# Altium footprint library lib_datalogger.PcbLib: 866 footprints (part 7 of 55)
Each footprint in its own frame and in the unit in brackets; x right, y up, seen from the top. Pads: shape width x height; smd on the part's side, far side on the other; paste and mask are expansions set on the pad; w line width, h text height; cw(c..) or ccw(c..) is an arc to the next point about the centre after c.
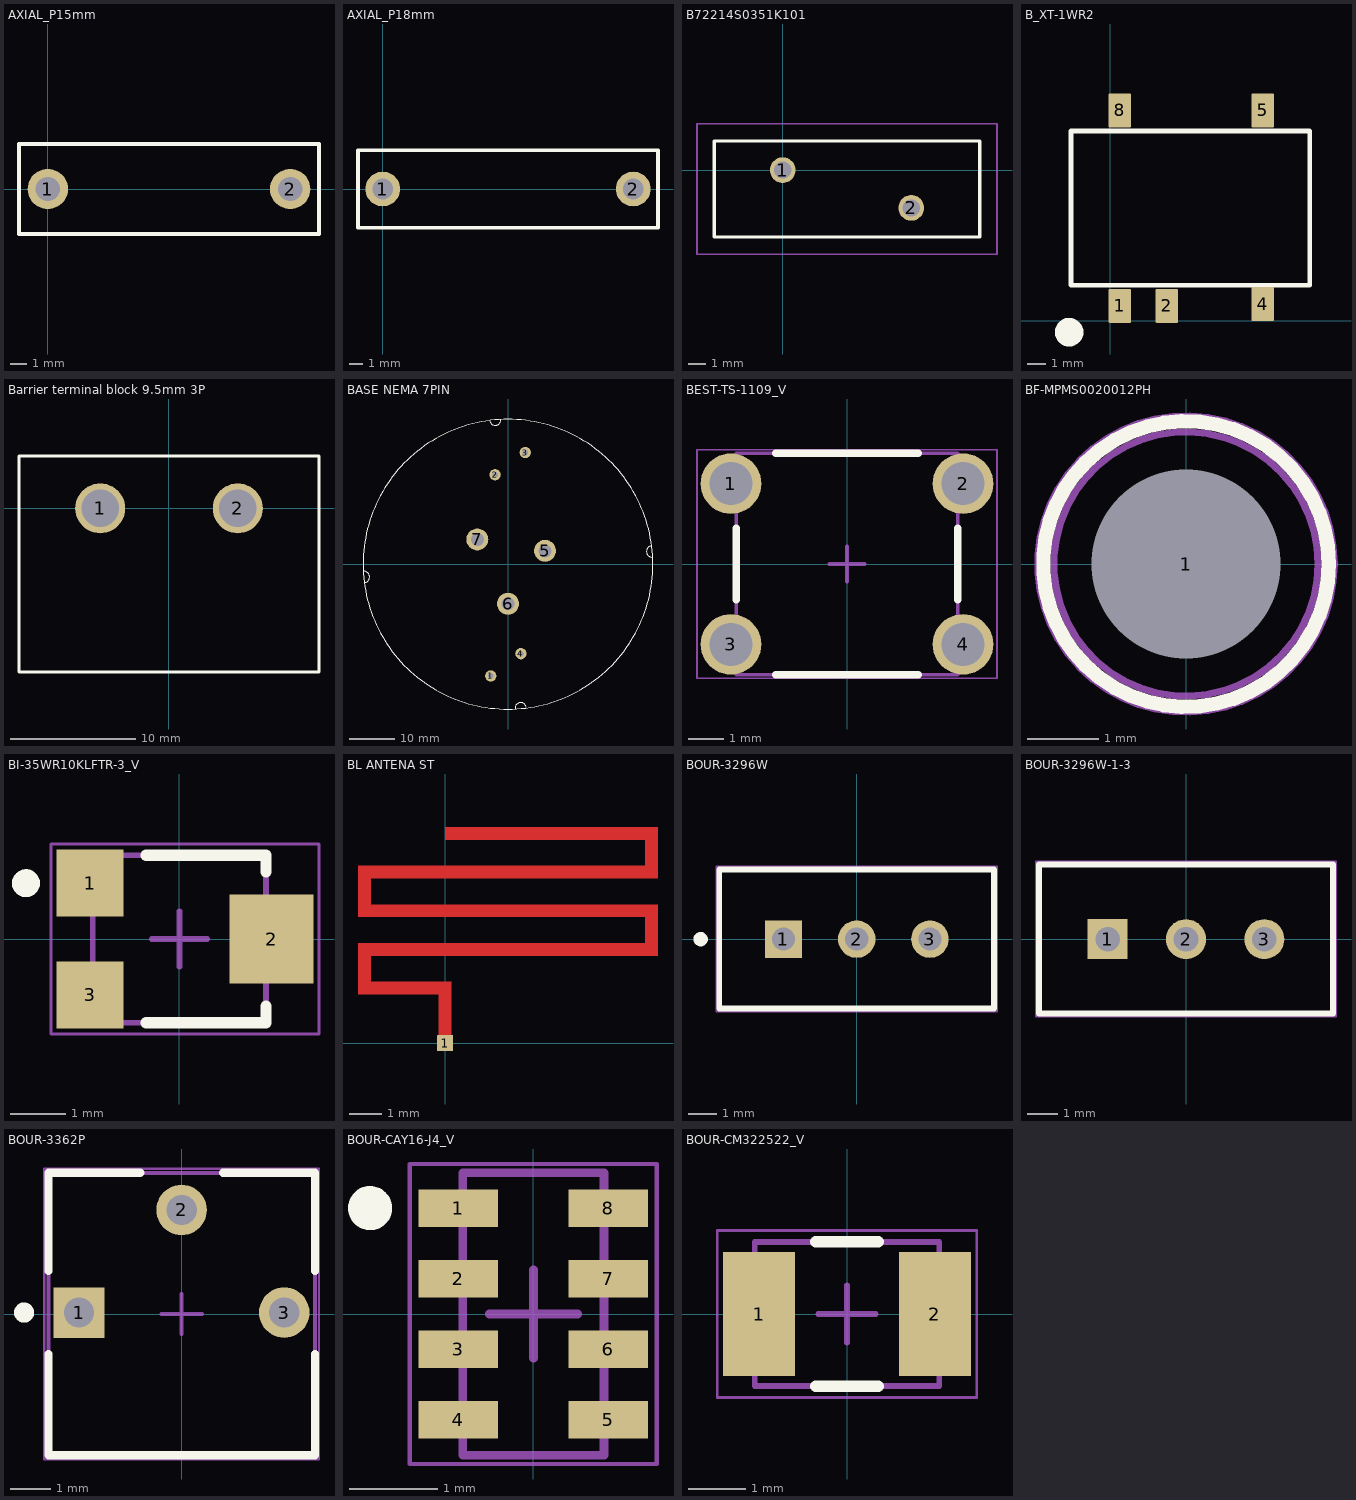
[diagram p6: the footprints below, top view; thin cyan lines are the x and y axes]

## AXIAL_P15mm [mm]
pads (2):
  round 2.5 hole 1.5: 1(0,0) 2(15,0)
Top Overlay:
  lines w0.254: -1.782,-2.794 16.782,-2.794 16.782,2.794 -1.782,2.794 -1.782,-2.794
3D body "User Library-RES-1W.STEP": height 5, standoff -3, extent -0.35,-2.503 15.59,2.497

## AXIAL_P18mm [mm]
pads (2):
  round 2.5 hole 1.5: 1(0,0) 2(18,0)
Top Overlay:
  lines w0.254: -1.782,-2.794 19.782,-2.794 19.782,2.794 -1.782,2.794 -1.782,-2.794
3D body "ind700.step": height 5.5, standoff -2.5, extent -0.29,-2.5 18.29,2.5

## B72214S0351K101 [mm]
pads (2):
  round 1.5 hole 1: 1(0,0) 2(7.5,-2.2)
Top Overlay:
  lines w0.2: -4,-3.9 11.5,-3.9 11.5,1.7 -4,1.7 -4,-3.9
Mechanical 13:
  lines w0.1: -4,-3.9 11.5,-3.9 11.5,1.7 -4,1.7 -4,-3.9
Mechanical 15:
  lines w0.1: -5,-4.9 12.5,-4.9 12.5,2.7 -5,2.7 -5,-4.9
3D body "B72214S0351K101.stp": height 18.6, standoff -5, extent -4,-3.9 11.5,1.7

## B_XT-1WR2 [mm]
pads (5):
  rrect10% 1.2x1.8 smd: 1(0.5,0.8) 2(3,0.8) 4(8.1,0.9) 5(8.1,11.2) 8(0.5,11.2)
Top Overlay:
  circle w0.8: c-2.2,-0.6 r0.361
  pour cut-out: -1.2,15
  lines w0.254: -2.1,1.9 -2.1,10.1 0.875,10.1 2.862,10.1 5.637,10.1 7.625,10.1 10.6,10.1 10.6,1.9 7.425,1.9 1.075,1.9 -2.1,1.9
3D body "User Library-B_XT-1WR2.STEP": height 7.45, standoff 0.2, extent -2.1,0.5 10.6,11.7

## BANDEJA_RS3-FA [mm]
3D body "1.3.4.110 - CHASSI DE FONTE RS-FA.stp": height 20.12, standoff -4.88, extent 0,0 164.7,129

## Barrier terminal block 9.5mm 3P [mm]
pads (2):
  round 4 hole 3: 1(-5.5,0) 2(5.5,0)
Top Overlay:
  lines w0.254: -12,-13.1 -12,4.2 12,4.2 12,-13.1 -12,-13.1
3D body "User Library-Screw terminal block 9_5mm.STEP": height 18.5, standoff -5, extent -10.65,-12.25 10.4,4.25

## BASE NEMA 7PIN [mm]
pads (7):
  round 2.48 hole 1.24: 1(-3.8,-24.57) 2(-2.83,19.68) 3(3.8,24.57) 4(2.83,-19.68)
  round 4.83 hole 2.83: 5(8.15,2.95) 6(0,-8.7) 7(-6.75,5.45)
Top Overlay:
  circle w0.254: c0,0 r31.873
  lines w0.254: -31.765,-1.552 cw(c-31.7,-2.8) -31.548,-4.041 ; -4.035,31.61 ccw(c-2.8,31.8) -1.55,31.8 ; 1.554,-31.796 cw(c2.8,-31.7) 4.033,-31.495 ; 31.544,4.04 ccw(c31.7,2.8) 31.762,1.552
3D body "c-2213871-1-a-3d.stp": height 3.1, standoff -32.98, extent -53.438,-53.438 53.439,53.439

## BEST-TS-1109_V [mm] "THD, 4-Leads, Body 6.2x6.2mm"
pads (4):
  round 1.7 hole 1.2: 1(-3.25,2.25) 2(3.25,2.25) 3(-3.25,-2.25) 4(3.25,-2.25)
Top Overlay:
  lines w0.2: -3.1,-1 -3.1,1 ; -2,-3.1 2,-3.1 ; -2,3.1 2,3.1 ; 3.1,-1 3.1,1
Mechanical 13:
  lines w0.1: -3.1,-3.1 3.1,-3.1 3.1,3.1 -3.1,3.1 -3.1,-3.1
Mechanical 15:
  lines w0.05: -4.2,-3.2 -4.2,3.2 4.2,3.2 4.2,-3.2 -4.2,-3.2
  lines w0.1: -0.5,0 0.5,0 ; 0,-0.5 0,0.5

## BF-MPMS0020012PH [mm] "Copper Pillar 9mm, M2 Screw"
height 11.99
pads (1):
  round 1 hole 2.65 unplated: 1(0,0)
Top Overlay:
  circle w0.2: c0,0 r2
Mechanical 13:
  circle w0.1: c0,0 r1.85
Mechanical 15:
  circle w0.05: c0,0 r2.1
3D body: height 11.99, standoff 0, extent -1.85,-1.848 1.85,1.849
3D body "screw-round-M2.0.stp": height 1.25, standoff -4.75, extent -1.789,-1.796 1.8,1.796

## BI-35WR10KLFTR-3_V [mm] "SMD, 3-Leads, Body 3x3.1mm"
height 1.8
pads (3):
  rect 1.2x1.2 smd: 1(-1.6,1) 3(-1.6,-1)
  rect 1.5x1.6 smd: 2(1.65,0)
Top Overlay:
  circle w0.25: c-2.75,1 r0.125
  lines w0.2: -0.6,-1.5 1.55,-1.5 1.55,-1.2 ; -0.6,1.5 1.55,1.5 1.55,1.2
Mechanical 13:
  lines w0.1: -1.55,-1.5 -1.55,1.5 1.55,1.5 1.55,-1.5 -1.55,-1.5
Mechanical 15:
  lines w0.05: -2.3,-1.7 2.5,-1.7 2.5,1.7 -2.3,1.7 -2.3,-1.7
  lines w0.1: -0.5,0 0.5,0 ; 0,-0.5 0,0.5
3D body: height 1.8, standoff 0.8, extent -0.249,-1.499 1.499,1.499
3D body: height 1.8, standoff 0.8, extent -1.499,-1.499 0.249,1.499
3D body: height 0.8, standoff 0.15, extent -1.55,-1.5 1.55,1.5

## BL ANTENA ST [mm]
pads (1):
  rrect10% 0.5x0.5 smd: 1(0,0)
Top Layer:
  rectangle: 0,6.3 6.6,6.7
  rectangle: 6.2,5.1 6.6,6.7
  rectangle: -2.7,5.1 6.6,5.5
  rectangle: -2.7,3.9 -2.3,5.5
  rectangle: -2.7,3.9 6.6,4.3
  region: 0.2,0 0.2,1.9 -0.2,1.9 -0.2,0
  rectangle: -2.7,1.5 0.2,1.9
  rectangle: -2.7,1.5 -2.3,3.1
  rectangle: -2.7,2.7 6.6,3.1
  rectangle: 6.2,2.7 6.6,4.3

## BOUR-3296W [mm] "THD, 3-Leads, Body 9.53x4.83mm, Pitch 2.54mm"
height 11.904
pads (3):
  rect 1.3x1.3 hole 0.8: 1(-2.54,0)
  round 1.3 hole 0.8: 2(0,0) 3(2.54,0)
Top Overlay:
  circle w0.25: c-5.415,0 r0.125
  lines w0.2: 4.765,-2.41 -4.765,-2.41 -4.765,2.42 4.765,2.42 4.765,-2.405
Mechanical 13:
  lines w0.1: -4.765,-2.41 -4.765,2.42 4.765,2.42 4.765,-2.41 -4.765,-2.41
Mechanical 15:
  lines w0.05: -4.865,-2.51 -4.865,2.52 4.865,2.52 4.865,-2.51 -4.865,-2.51
  lines w0.1: -0.5,0 0.5,0 ; 0,-0.5 0,0.5
3D body "3296W.stp": height 11.55, standoff -6.4, extent -4.762,-2.405 4.762,2.421

## BOUR-3296W-1-3 [mm] "THD, 3-Leads, Body 9.53x4.83mm, Pitch 2.54mm"
height 11.55
pads (3):
  rect 1.3x1.3 hole 0.8: 1(-2.54,0)
  round 1.3 hole 0.8: 2(0,0) 3(2.54,0)
Top Overlay:
  lines w0.2: -4.765,-2.41 -4.765,2.42 4.765,2.42 4.765,-2.41 -4.765,-2.41
Mechanical 13:
  lines w0.1: -4.765,-2.41 4.765,-2.41 4.765,2.42 -4.765,2.42 -4.765,-2.41
Mechanical 15:
  lines w0.05: -4.865,-2.51 4.865,-2.51 4.865,2.52 -4.865,2.52 -4.865,-2.51
  lines w0.1: -0.5,0 0.5,0 ; 0,-0.5 0,0.5
3D body "3296W.stp": height 11.55, standoff -6.4, extent -4.762,-2.41 4.762,2.416

## BOUR-3362P [mm] "THD, 3-Leads, Body 6.6x6.99mm, Pitch 2.54mm"
height 4.95
pads (3):
  rect 1.25x1.25 hole 0.75: 1(-2.54,0.035)
  round 1.25 hole 0.75: 2(0,2.575) 3(2.54,0.035)
Top Overlay:
  circle w0.25: c-3.9,0.035 r0.125
  lines w0.2: -3.3,-0.99 -3.3,-3.495 3.3,-3.495 3.3,-0.99 ; -3.3,1.06 -3.3,3.495 -1.025,3.495 ; 1.025,3.495 3.3,3.495 3.3,1.06
Mechanical 13:
  lines w0.1: -3.3,-3.495 3.3,-3.495 3.3,3.495 -3.3,3.495 -3.3,-3.495
Mechanical 15:
  lines w0.05: -3.4,-3.595 -3.4,3.595 3.4,3.595 3.4,-3.595 -3.4,-3.595
  lines w0.1: -0.5,0 0.5,0 ; 0,-0.5 0,0.5
3D body "User Library-R_3362P.STEP": height 4.5, standoff -3, extent -3.3,-3.495 3.3,3.495

## BOUR-CAY16-J4_V [mm] "SMD, 8-Leads, Body 1.6x3.2mm, Pitch 0.8mm"
height 0.6
pads (8):
  rect 0.9x0.425 smd: 1(-0.85,1.2) 2(-0.85,0.4) 3(-0.85,-0.4) 4(-0.85,-1.2) 5(0.85,-1.2) 6(0.85,-0.4) 7(0.85,0.4) 8(0.85,1.2)
Top Overlay:
  circle w0.25: c-1.85,1.2 r0.125
Mechanical 13:
  lines w0.1: -0.8,-1.6 -0.8,1.6 0.8,1.6 0.8,-1.6 -0.8,-1.6
Mechanical 15:
  lines w0.05: -1.4,-1.7 -1.4,1.7 1.4,1.7 1.4,-1.7 -1.4,-1.7
  lines w0.1: -0.5,0 0.5,0 ; 0,-0.5 0,0.5
3D body "BOUR-CAY16-J4-8.stp": height 0.6, standoff 0, extent -0.8,-1.6 0.8,1.6

## BOUR-CM322522_V [mm] "Inductor, 2-Leads, Body 3.2x2.5mm, Pitch 3.05mm"
height 2.4
pads (2):
  rect 1.25x2.15 smd: 1(-1.525,0) 2(1.525,0)
Top Overlay:
  lines w0.2: -0.54,-1.25 0.54,-1.25 ; -0.54,1.25 0.54,1.25
Mechanical 13:
  lines w0.1: -1.6,-1.25 -1.6,1.25 1.6,1.25 1.6,-1.25 -1.6,-1.25
Mechanical 15:
  lines w0.05: -2.25,-1.45 -2.25,1.45 2.25,1.45 2.25,-1.45 -2.25,-1.45
  lines w0.1: -0.5,0 0.5,0 ; 0,-0.5 0,0.5
3D body "INDM2925X24L.step": height 2.4, standoff 0, extent -1.77,-1.35 1.77,1.35